# Altium footprint library WR-PHD_Pin Header.PcbLib: 230 footprints (part 9 of 15)
Each footprint in its own frame and in the unit in brackets; x right, y up, seen from the top. Pads: shape width x height; smd on the part's side, far side on the other; paste and mask are expansions set on the pad; w line width, h text height; cw(c..) or ccw(c..) is an arc to the next point about the centre after c.
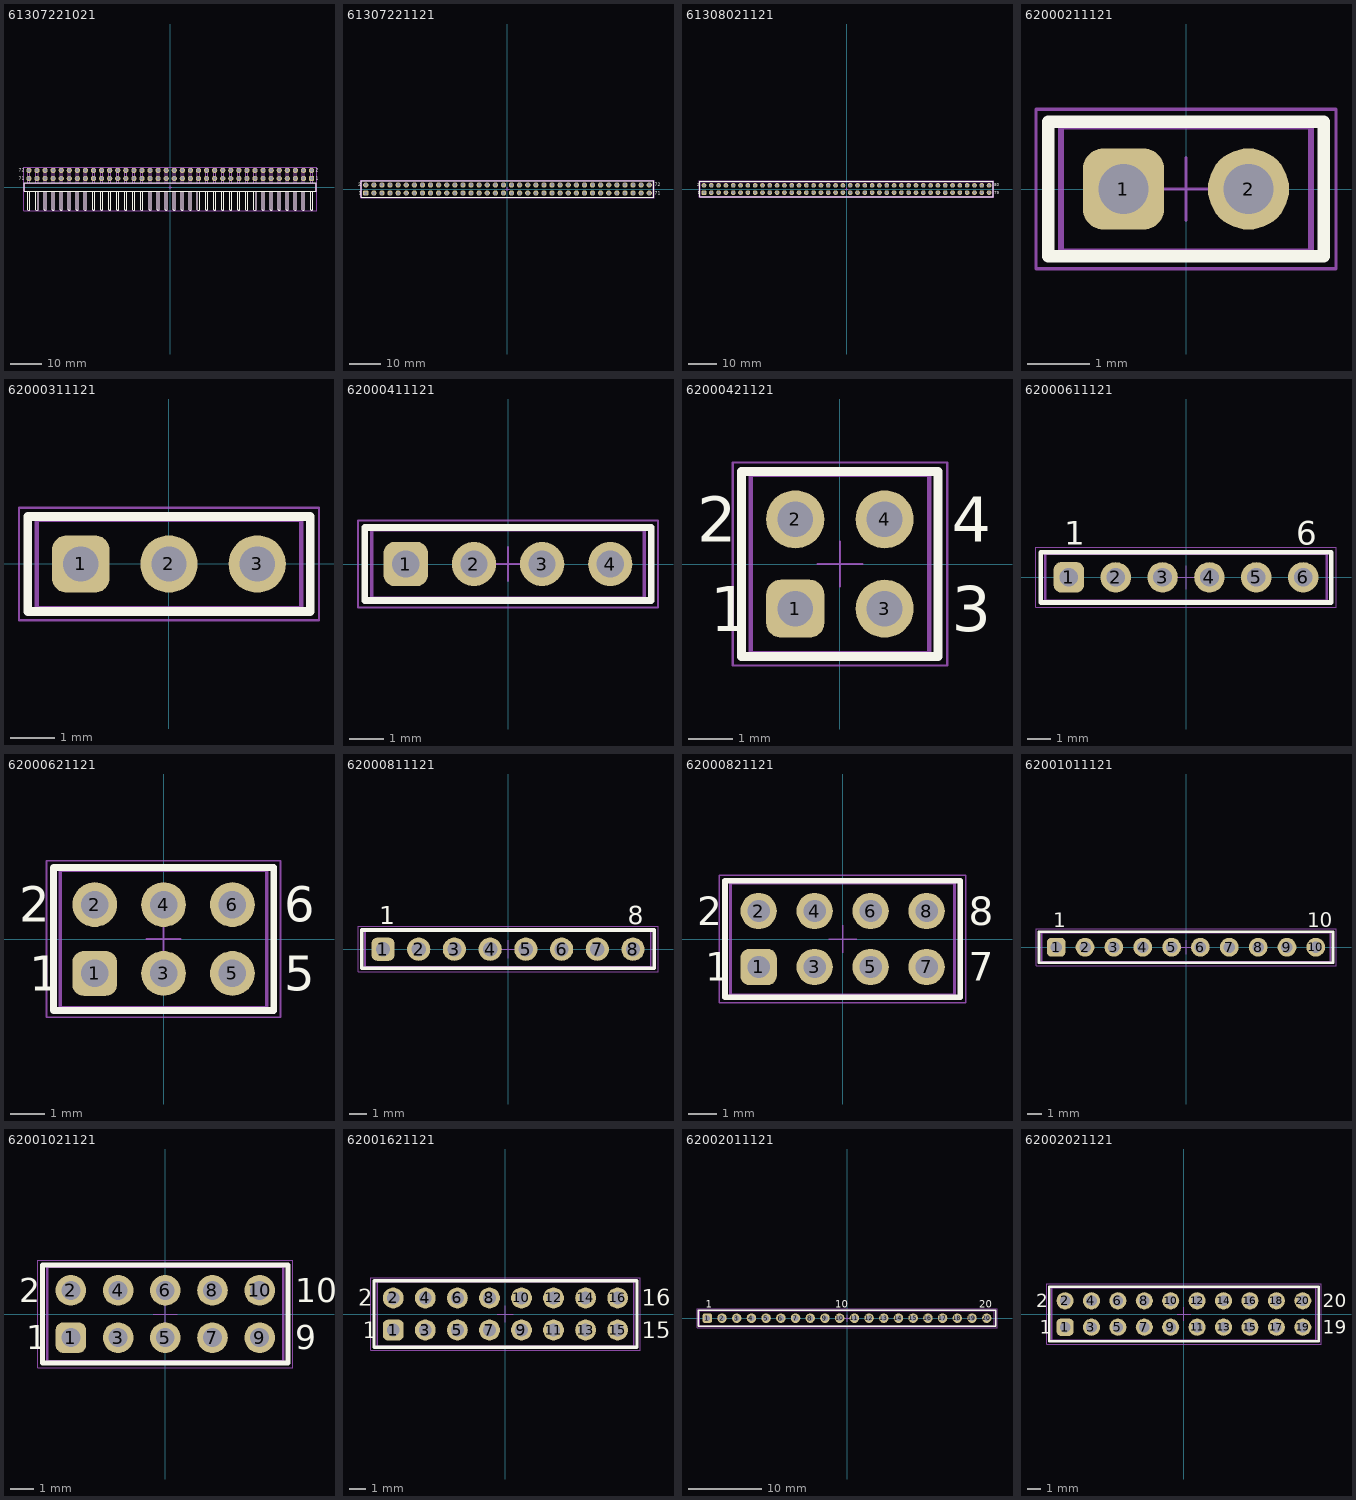
[diagram p8: the footprints below, top view; thin cyan lines are the x and y axes]

## 61307221021 [mm] "Pin Header, pitch 2.54 mm, THT, Angled, dual row, 72p"
height 5.08
pads (72):
  rrect50% 1.65x1.65 hole 1.1: 1(44.45,2.73)
  round 1.65 hole 1.1: 2(44.45,5.27) 3(41.91,2.73) 4(41.91,5.27) 5(39.37,2.73) 6(39.37,5.27) 7(36.83,2.73) 8(36.83,5.27) 9(34.29,2.73) 10(34.29,5.27) 11(31.75,2.73) 12(31.75,5.27) 13(29.21,2.73) 14(29.21,5.27) 15(26.67,2.73) 16(26.67,5.27) 17(24.13,2.73) 18(24.13,5.27) 19(21.59,2.73) 20(21.59,5.27) 21(19.05,2.73) 22(19.05,5.27) 23(16.51,2.73) 24(16.51,5.27) 25(13.97,2.73) 26(13.97,5.27) 27(11.43,2.73) 28(11.43,5.27) 29(8.89,2.73) 30(8.89,5.27) 31(6.35,2.73) 32(6.35,5.27) 33(3.81,2.73) 34(3.81,5.27) 35(1.27,2.73) 36(1.27,5.27) 37(-1.27,2.73) 38(-1.27,5.27) 39(-3.81,2.73) 40(-3.81,5.27) 41(-6.35,2.73) 42(-6.35,5.27) 43(-8.89,2.73) 44(-8.89,5.27) 45(-11.43,2.73) 46(-11.43,5.27) 47(-13.97,2.73) 48(-13.97,5.27) 49(-16.51,2.73) 50(-16.51,5.27) 51(-19.05,2.73) 52(-19.05,5.27) 53(-21.59,2.73) 54(-21.59,5.27) 55(-24.13,2.73) 56(-24.13,5.27) 57(-26.67,2.73) 58(-26.67,5.27) 59(-29.21,2.73) 60(-29.21,5.27) 61(-31.75,2.73) 62(-31.75,5.27) 63(-34.29,2.73) 64(-34.29,5.27) 65(-36.83,2.73) 66(-36.83,5.27) 67(-39.37,2.73) 68(-39.37,5.27) 69(-41.91,2.73) 70(-41.91,5.27) 71(-44.45,2.73) 72(-44.45,5.27)
Top Overlay:
  drawing of 184 lines, arcs and shapes, not listed
  text "71" at -47.57,2.2 h1.02
  text "72" at -47.57,4.8 h1.02
  text "1" at 45.78,2.2 h1.02
  text "2" at 45.78,4.8 h1.02
Top Designator:
  text ".Designator" at -7.498,-0.5 h1.5
Top Component Outline:
  drawing of 329 lines, arcs and shapes, not listed
Top 3D Body:
  drawing of 329 lines, arcs and shapes, not listed
Top Courtyard:
  lines w0.05: -0.5,0 0.5,0 ; 0,-0.5 0,0.5 ; -46.07,-7.47 -46.07,6.295 46.07,6.295 46.07,-7.47 -46.07,-7.47
3D body "61307221021.stp": height 5.12, standoff -2.96, extent -45.72,-7.27 45.72,5.63

## 61307221121 [mm] "Pin Header, pitch 2.54 mm, THT, Vertical, dual row, 72p"
height 8.54
pads (72):
  rrect50% 1.65x1.65 hole 1.1: 1(-44.45,-1.27)
  round 1.65 hole 1.1: 2(-44.45,1.27) 3(-41.91,-1.27) 4(-41.91,1.27) 5(-39.37,-1.27) 6(-39.37,1.27) 7(-36.83,-1.27) 8(-36.83,1.27) 9(-34.29,-1.27) 10(-34.29,1.27) 11(-31.75,-1.27) 12(-31.75,1.27) 13(-29.21,-1.27) 14(-29.21,1.27) 15(-26.67,-1.27) 16(-26.67,1.27) 17(-24.13,-1.27) 18(-24.13,1.27) 19(-21.59,-1.27) 20(-21.59,1.27) 21(-19.05,-1.27) 22(-19.05,1.27) 23(-16.51,-1.27) 24(-16.51,1.27) 25(-13.97,-1.27) 26(-13.97,1.27) 27(-11.43,-1.27) 28(-11.43,1.27) 29(-8.89,-1.27) 30(-8.89,1.27) 31(-6.35,-1.27) 32(-6.35,1.27) 33(-3.81,-1.27) 34(-3.81,1.27) 35(-1.27,-1.27) 36(-1.27,1.27) 37(1.27,-1.27) 38(1.27,1.27) 39(3.81,-1.27) 40(3.81,1.27) 41(6.35,-1.27) 42(6.35,1.27) 43(8.89,-1.27) 44(8.89,1.27) 45(11.43,-1.27) 46(11.43,1.27) 47(13.97,-1.27) 48(13.97,1.27) 49(16.51,-1.27) 50(16.51,1.27) 51(19.05,-1.27) 52(19.05,1.27) 53(21.59,-1.27) 54(21.59,1.27) 55(24.13,-1.27) 56(24.13,1.27) 57(26.67,-1.27) 58(26.67,1.27) 59(29.21,-1.27) 60(29.21,1.27) 61(31.75,-1.27) 62(31.75,1.27) 63(34.29,-1.27) 64(34.29,1.27) 65(36.83,-1.27) 66(36.83,1.27) 67(39.37,-1.27) 68(39.37,1.27) 69(41.91,-1.27) 70(41.91,1.27) 71(44.45,-1.27) 72(44.45,1.27)
Top Overlay:
  lines w0.2: -45.87,-2.615 -45.87,2.615 45.87,2.615 45.87,-2.615 -45.87,-2.615
  text "1" at -46.58,-1.8 h1.02
  text "2" at -46.88,0.9 h1.02
  text "71" at 46.18,-1.8 h1.02
  text "72" at 46.18,0.9 h1.02
Top Designator:
  text ".Designator" at -7.498,-0.5 h1.5
Top Component Outline:
  lines w0.1: -45.72,-2.54 -45.72,2.54 45.72,2.54 45.72,-2.54 -45.72,-2.54
Top 3D Body:
  lines w0.1: -45.72,-2.54 -45.72,2.54 45.72,2.54 45.72,-2.54 -45.72,-2.54
Top Courtyard:
  lines w0.05: -0.5,0 0.5,0 ; 0,-0.5 0,0.5 ; -46.07,-2.815 46.07,-2.815 46.07,2.815 -46.07,2.815 -46.07,-2.815
3D body "61307221121.stp": height 8.59, standoff -2.95, extent -45.72,-2.54 45.72,2.54

## 61308021121 [mm] "Pin Header, pitch 2.54 mm, THT, Vertical, dual row, 80p"
height 8.54
pads (80):
  rrect50% 1.65x1.65 hole 1.1: 1(-49.53,-1.27)
  round 1.65 hole 1.1: 2(-49.53,1.27) 3(-46.99,-1.27) 4(-46.99,1.27) 5(-44.45,-1.27) 6(-44.45,1.27) 7(-41.91,-1.27) 8(-41.91,1.27) 9(-39.37,-1.27) 10(-39.37,1.27) 11(-36.83,-1.27) 12(-36.83,1.27) 13(-34.29,-1.27) 14(-34.29,1.27) 15(-31.75,-1.27) 16(-31.75,1.27) 17(-29.21,-1.27) 18(-29.21,1.27) 19(-26.67,-1.27) 20(-26.67,1.27) 21(-24.13,-1.27) 22(-24.13,1.27) 23(-21.59,-1.27) 24(-21.59,1.27) 25(-19.05,-1.27) 26(-19.05,1.27) 27(-16.51,-1.27) 28(-16.51,1.27) 29(-13.97,-1.27) 30(-13.97,1.27) 31(-11.43,-1.27) 32(-11.43,1.27) 33(-8.89,-1.27) 34(-8.89,1.27) 35(-6.35,-1.27) 36(-6.35,1.27) 37(-3.81,-1.27) 38(-3.81,1.27) 39(-1.27,-1.27) 40(-1.27,1.27) 41(1.27,-1.27) 42(1.27,1.27) 43(3.81,-1.27) 44(3.81,1.27) 45(6.35,-1.27) 46(6.35,1.27) 47(8.89,-1.27) 48(8.89,1.27) 49(11.43,-1.27) 50(11.43,1.27) 51(13.97,-1.27) 52(13.97,1.27) 53(16.51,-1.27) 54(16.51,1.27) 55(19.05,-1.27) 56(19.05,1.27) 57(21.59,-1.27) 58(21.59,1.27) 59(24.13,-1.27) 60(24.13,1.27) 61(26.67,-1.27) 62(26.67,1.27) 63(29.21,-1.27) 64(29.21,1.27) 65(31.75,-1.27) 66(31.75,1.27) 67(34.29,-1.27) 68(34.29,1.27) 69(36.83,-1.27) 70(36.83,1.27) 71(39.37,-1.27) 72(39.37,1.27) 73(41.91,-1.27) 74(41.91,1.27) 75(44.45,-1.27) 76(44.45,1.27) 77(46.99,-1.27) 78(46.99,1.27) 79(49.53,-1.27) 80(49.53,1.27)
Top Overlay:
  lines w0.2: -50.95,-2.615 -50.95,2.615 50.95,2.615 50.95,-2.615 -50.95,-2.615
  text "1" at -51.66,-1.8 h1.02
  text "2" at -51.96,0.9 h1.02
  text "79" at 51.26,-1.8 h1.02
  text "80" at 51.26,0.9 h1.02
Top Designator:
  text ".Designator" at -7.498,-0.5 h1.5
Top Component Outline:
  lines w0.1: -50.8,-2.54 -50.8,2.54 50.8,2.54 50.8,-2.54 -50.8,-2.54
Top 3D Body:
  lines w0.1: -50.8,-2.54 -50.8,2.54 50.8,2.54 50.8,-2.54 -50.8,-2.54
Top Courtyard:
  lines w0.05: -0.5,0 0.5,0 ; 0,-0.5 0,0.5 ; -51.15,-2.815 51.15,-2.815 51.15,2.815 -51.15,2.815 -51.15,-2.815
3D body "61308021121.stp": height 8.59, standoff -2.95, extent -50.8,-2.54 50.8,2.54

## 62000211121 [mm] "Pin Header, pitch 2.00 mm, THT, Vertical, single row, 2p"
height 6.35
pads (2):
  rrect50% 1.3x1.3 hole 0.8: 1(-1,0)
  round 1.3 hole 0.8: 2(1,0)
Top Overlay:
  lines w0.2: -2.2,-1.075 2.2,-1.075 2.2,1.075 -2.2,1.075 -2.2,-1.075
Top Designator:
  text ".Designator" at -5.998,-0.4 h1.2
Top Component Outline:
  lines w0.1: -2,-1 2,-1 2,1 -2,1 -2,-1
Top 3D Body:
  lines w0.1: -2,-1 2,-1 2,1 -2,1 -2,-1
Top Courtyard:
  lines w0.05: -0.5,0 0.5,0 ; 0,-0.5 0,0.5 ; -2.4,-1.275 2.4,-1.275 2.4,1.275 -2.4,1.275 -2.4,-1.275
3D body "62000211121.stp": height 6.05, standoff -2.65, extent -2,-1 2,1

## 62000311121 [mm] "Pin Header, pitch 2.00 mm, THT, Vertical, single row, 3p"
height 6.35
pads (3):
  rrect50% 1.3x1.3 hole 0.8: 1(-2,0)
  round 1.3 hole 0.8: 2(0,0) 3(2,0)
Top Overlay:
  lines w0.2: -3.2,-1.075 -3.2,1.075 3.2,1.075 3.2,-1.075 -3.2,-1.075
Top Designator:
  text ".Designator" at -5.998,-0.4 h1.2
Top Component Outline:
  lines w0.1: -3,-1 -3,1 3,1 3,-1 -3,-1
Top 3D Body:
  lines w0.1: -3,-1 -3,1 3,1 3,-1 -3,-1
Top Courtyard:
  lines w0.05: -0.5,0 0.5,0 ; 0,-0.5 0,0.5 ; -3.4,-1.275 -3.4,1.275 3.4,1.275 3.4,-1.275 -3.4,-1.275
3D body "62000311121.stp": height 6.05, standoff -2.65, extent -3,-1 3,1

## 62000411121 [mm] "Pin Header, pitch 2.00 mm, THT, Vertical, single row, 4p"
height 6.35
pads (4):
  rrect50% 1.3x1.3 hole 0.8: 1(-3,0)
  round 1.3 hole 0.8: 2(-1,0) 3(1,0) 4(3,0)
Top Overlay:
  lines w0.2: -4.2,-1.075 4.2,-1.075 4.2,1.075 -4.2,1.075 -4.2,-1.075
Top Designator:
  text ".Designator" at -5.998,-0.4 h1.2
Top Component Outline:
  lines w0.1: -4,-1 4,-1 4,1 -4,1 -4,-1
Top 3D Body:
  lines w0.1: -4,-1 4,-1 4,1 -4,1 -4,-1
Top Courtyard:
  lines w0.05: -0.5,0 0.5,0 ; 0,-0.5 0,0.5 ; -4.4,-1.275 4.4,-1.275 4.4,1.275 -4.4,1.275 -4.4,-1.275
3D body "62000411121.stp": height 6.05, standoff -2.65, extent -4,-1 4,1

## 62000421121 [mm] "2.00 mm THT Dual Pin Header, 4p"
height 6
pads (4):
  rrect50% 1.3x1.3 hole 0.8: 1(-1,-1)
  round 1.3 hole 0.8: 2(-1,1) 3(1,-1) 4(1,1)
Top Overlay:
  lines w0.2: -2.2,-2.075 2.2,-2.075 2.2,2.075 -2.2,2.075 -2.2,-2.075
  text "2" at -3.2,0.5 h1.02
  text "4" at 2.5,0.5 h1.02
  text "3" at 2.5,-1.5 h1.02
  text "1" at -2.9,-1.5 h1.02
Top Designator:
  text ".Designator" at -7.498,-0.5 h1.5
Top Component Outline:
  lines w0.1: -2,-2 2,-2 2,2 -2,2 -2,-2
Top 3D Body:
  lines w0.1: -2,-2 2,-2 2,2 -2,2 -2,-2
Top Courtyard:
  lines w0.05: -0.5,0 0.5,0 ; 0,-0.5 0,0.5 ; -2.4,-2.275 -2.4,2.275 2.4,2.275 2.4,-2.275 -2.4,-2.275
3D body "62000421121.stp": height 6.05, standoff -2.65, extent -2,-2 2,2

## 62000611121 [mm] "Pin Header, pitch 2.00 mm, THT, Vertical, single row, 6p"
height 6.35
pads (6):
  rrect50% 1.3x1.3 hole 0.8: 1(-5,0)
  round 1.3 hole 0.8: 2(-3,0) 3(-1,0) 4(1,0) 5(3,0) 6(5,0)
Top Overlay:
  lines w0.2: -6.2,-1.075 6.2,-1.075 6.2,1.075 -6.2,1.075 -6.2,-1.075
  text "6" at 4.7,1.4 h1.02
  text "1" at -5.2,1.4 h1.02
Top Designator:
  text ".Designator" at -5.998,-0.4 h1.2
Top Component Outline:
  lines w0.1: -6,-1 6,-1 6,1 -6,1 -6,-1
Top 3D Body:
  lines w0.1: -6,-1 6,-1 6,1 -6,1 -6,-1
Top Courtyard:
  lines w0.05: -0.5,0 0.5,0 ; 0,-0.5 0,0.5 ; -6.4,-1.275 6.4,-1.275 6.4,1.275 -6.4,1.275 -6.4,-1.275
3D body "62000611121.stp": height 6.05, standoff -2.65, extent -6,-1 6,1

## 62000621121 [mm] "2.00 mm THT Dual Pin Header, 6p"
height 6
pads (6):
  rrect50% 1.3x1.3 hole 0.8: 1(-2,-1)
  round 1.3 hole 0.8: 2(-2,1) 3(0,-1) 4(0,1) 5(2,-1) 6(2,1)
Top Overlay:
  lines w0.2: -3.2,-2.075 -3.2,2.075 3.2,2.075 3.2,-2.075 -3.2,-2.075
  text "1" at -3.9,-1.5 h1.02
  text "2" at -4.2,0.5 h1.02
  text "6" at 3.5,0.5 h1.02
  text "5" at 3.5,-1.5 h1.02
Top Designator:
  text ".Designator" at -7.498,-0.5 h1.5
Top Component Outline:
  lines w0.1: -3,-2 -3,2 3,2 3,-2 -3,-2
Top 3D Body:
  lines w0.1: -3,-2 -3,2 3,2 3,-2 -3,-2
Top Courtyard:
  lines w0.05: -0.5,0 0.5,0 ; 0,-0.5 0,0.5 ; -3.4,-2.275 3.4,-2.275 3.4,2.275 -3.4,2.275 -3.4,-2.275
3D body "62000621121.stp": height 6.05, standoff -2.65, extent -3,-2 3,2

## 62000811121 [mm] "Pin Header, pitch 2.00 mm, THT, Vertical, single row, 8p"
height 6.35
pads (8):
  rrect50% 1.3x1.3 hole 0.8: 1(-7,0)
  round 1.3 hole 0.8: 2(-5,0) 3(-3,0) 4(-1,0) 5(1,0) 6(3,0) 7(5,0) 8(7,0)
Top Overlay:
  lines w0.2: -8.2,-1.075 8.2,-1.075 8.2,1.075 -8.2,1.075 -8.2,-1.075
  text "8" at 6.7,1.4 h1.02
  text "1" at -7.2,1.4 h1.02
Top Designator:
  text ".Designator" at -5.998,-0.4 h1.2
Top Component Outline:
  lines w0.1: -8,-1 8,-1 8,1 -8,1 -8,-1
Top 3D Body:
  lines w0.1: -8,-1 8,-1 8,1 -8,1 -8,-1
Top Courtyard:
  lines w0.05: -0.5,0 0.5,0 ; 0,-0.5 0,0.5 ; -8.4,-1.275 8.4,-1.275 8.4,1.275 -8.4,1.275 -8.4,-1.275
3D body "62000811121.stp": height 6.05, standoff -2.65, extent -8,-1 8,1

## 62000821121 [mm] "2.00 mm THT Dual Pin Header, 8p"
height 6
pads (8):
  rrect50% 1.3x1.3 hole 0.8: 1(-3,-1)
  round 1.3 hole 0.8: 2(-3,1) 3(-1,-1) 4(-1,1) 5(1,-1) 6(1,1) 7(3,-1) 8(3,1)
Top Overlay:
  lines w0.2: -4.2,-2.075 4.2,-2.075 4.2,2.075 -4.2,2.075 -4.2,-2.075
  text "2" at -5.2,0.5 h1.02
  text "1" at -4.9,-1.5 h1.02
  text "8" at 4.5,0.5 h1.02
  text "7" at 4.5,-1.5 h1.02
Top Designator:
  text ".Designator" at -7.498,-0.5 h1.5
Top Component Outline:
  lines w0.1: -4,-2 4,-2 4,2 -4,2 -4,-2
Top 3D Body:
  lines w0.1: -4,-2 4,-2 4,2 -4,2 -4,-2
Top Courtyard:
  lines w0.05: -0.5,0 0.5,0 ; 0,-0.5 0,0.5 ; -4.4,-2.275 -4.4,2.275 4.4,2.275 4.4,-2.275 -4.4,-2.275
3D body "62000821121.stp": height 6.05, standoff -2.65, extent -4,-2 4,2

## 62001011121 [mm] "Pin Header, pitch 2.00 mm, THT, Vertical, single row, 10p"
height 6.35
pads (10):
  rrect50% 1.3x1.3 hole 0.8: 1(-9,0)
  round 1.3 hole 0.8: 2(-7,0) 3(-5,0) 4(-3,0) 5(-1,0) 6(1,0) 7(3,0) 8(5,0) 9(7,0) 10(9,0)
Top Overlay:
  lines w0.2: -10.2,-1.075 -10.2,1.075 10.2,1.075 10.2,-1.075 -10.2,-1.075
  text "10" at 8.4,1.4 h1.02
  text "1" at -9.2,1.4 h1.02
Top Designator:
  text ".Designator" at -5.998,-0.4 h1.2
Top Component Outline:
  lines w0.1: -10,-1 -10,1 10,1 10,-1 -10,-1
Top 3D Body:
  lines w0.1: -10,-1 -10,1 10,1 10,-1 -10,-1
Top Courtyard:
  lines w0.05: -0.5,0 0.5,0 ; 0,-0.5 0,0.5 ; -10.4,-1.275 -10.4,1.275 10.4,1.275 10.4,-1.275 -10.4,-1.275
3D body "62001011121.stp": height 6.05, standoff -2.65, extent -10,-1 10,1

## 62001021121 [mm] "2.00 mm THT Dual Pin Header, 10p"
height 6
pads (10):
  rrect50% 1.3x1.3 hole 0.8: 1(-4,-1)
  round 1.3 hole 0.8: 2(-4,1) 3(-2,-1) 4(-2,1) 5(0,-1) 6(0,1) 7(2,-1) 8(2,1) 9(4,-1) 10(4,1)
Top Overlay:
  lines w0.2: -5.2,-2.075 -5.2,2.075 5.2,2.075 5.2,-2.075 -5.2,-2.075
  text "1" at -5.9,-1.5 h1.02
  text "2" at -6.2,0.5 h1.02
  text "10" at 5.5,0.5 h1.02
  text "9" at 5.5,-1.5 h1.02
Top Designator:
  text ".Designator" at -7.498,-0.5 h1.5
Top Component Outline:
  lines w0.1: -5,-2 -5,2 5,2 5,-2 -5,-2
Top 3D Body:
  lines w0.1: -5,-2 -5,2 5,2 5,-2 -5,-2
Top Courtyard:
  lines w0.05: -0.5,0 0.5,0 ; 0,-0.5 0,0.5 ; -5.4,-2.275 5.4,-2.275 5.4,2.275 -5.4,2.275 -5.4,-2.275
3D body "62001021121.stp": height 6.05, standoff -2.65, extent -5,-2 5,2

## 62001621121 [mm] "2.00 mm THT Dual Pin Header, 16p"
height 6
pads (16):
  rrect50% 1.3x1.3 hole 0.8: 1(-7,-1)
  round 1.3 hole 0.8: 2(-7,1) 3(-5,-1) 4(-5,1) 5(-3,-1) 6(-3,1) 7(-1,-1) 8(-1,1) 9(1,-1) 10(1,1) 11(3,-1) 12(3,1) 13(5,-1) 14(5,1) 15(7,-1) 16(7,1)
Top Overlay:
  lines w0.2: -8.2,-2.075 8.2,-2.075 8.2,2.075 -8.2,2.075 -8.2,-2.075
  text "2" at -9.2,0.5 h1.02
  text "1" at -8.9,-1.5 h1.02
  text "16" at 8.5,0.5 h1.02
  text "15" at 8.5,-1.5 h1.02
Top Designator:
  text ".Designator" at -7.498,-0.5 h1.5
Top Component Outline:
  lines w0.1: -8,-2 8,-2 8,2 -8,2 -8,-2
Top 3D Body:
  lines w0.1: -8,-2 8,-2 8,2 -8,2 -8,-2
Top Courtyard:
  lines w0.05: -0.5,0 0.5,0 ; 0,-0.5 0,0.5 ; -8.4,-2.275 -8.4,2.275 8.4,2.275 8.4,-2.275 -8.4,-2.275
3D body "62001621121.stp": height 6.05, standoff -2.65, extent -8,-2 8,2

## 62002011121 [mm] "Pin Header, pitch 2.00 mm, THT, Vertical, single row, 20p"
height 6.35
pads (20):
  rrect50% 1.3x1.3 hole 0.8: 1(-19,0)
  round 1.3 hole 0.8: 2(-17,0) 3(-15,0) 4(-13,0) 5(-11,0) 6(-9,0) 7(-7,0) 8(-5,0) 9(-3,0) 10(-1,0) 11(1,0) 12(3,0) 13(5,0) 14(7,0) 15(9,0) 16(11,0) 17(13,0) 18(15,0) 19(17,0) 20(19,0)
Top Overlay:
  lines w0.2: -20.2,-1.075 20.2,-1.075 20.2,1.075 -20.2,1.075 -20.2,-1.075
  text "1" at -19.2,1.4 h1.02
  text "10" at -1.6,1.4 h1.02
  text "20" at 18,1.4 h1.02
Top Designator:
  text ".Designator" at -5.998,-0.4 h1.2
Top Component Outline:
  lines w0.1: -20,-1 20,-1 20,1 -20,1 -20,-1
Top 3D Body:
  lines w0.1: -20,-1 20,-1 20,1 -20,1 -20,-1
Top Courtyard:
  lines w0.05: -0.5,0 0.5,0 ; 0,-0.5 0,0.5 ; -20.4,-1.275 20.4,-1.275 20.4,1.275 -20.4,1.275 -20.4,-1.275
3D body "62002011121.stp": height 6.05, standoff -2.65, extent -20,-1 20,1

## 62002021121 [mm] "2.00 mm THT Dual Pin Header, 20p"
height 6
pads (20):
  rrect50% 1.3x1.3 hole 0.8: 1(-9,-1)
  round 1.3 hole 0.8: 2(-9,1) 3(-7,-1) 4(-7,1) 5(-5,-1) 6(-5,1) 7(-3,-1) 8(-3,1) 9(-1,-1) 10(-1,1) 11(1,-1) 12(1,1) 13(3,-1) 14(3,1) 15(5,-1) 16(5,1) 17(7,-1) 18(7,1) 19(9,-1) 20(9,1)
Top Overlay:
  lines w0.2: -10.2,-2.075 -10.2,2.075 10.2,2.075 10.2,-2.075 -10.2,-2.075
  text "1" at -10.9,-1.5 h1.02
  text "2" at -11.2,0.5 h1.02
  text "20" at 10.5,0.5 h1.02
  text "19" at 10.5,-1.5 h1.02
Top Designator:
  text ".Designator" at -7.498,-0.5 h1.5
Top Component Outline:
  lines w0.1: -10,-2 -10,2 10,2 10,-2 -10,-2
Top 3D Body:
  lines w0.1: -10,-2 -10,2 10,2 10,-2 -10,-2
Top Courtyard:
  lines w0.05: -0.5,0 0.5,0 ; 0,-0.5 0,0.5 ; -10.4,-2.275 10.4,-2.275 10.4,2.275 -10.4,2.275 -10.4,-2.275
3D body "62002021121.stp": height 6.05, standoff -2.65, extent -10,-2 10,2